# Altium footprint library En.PcbLib: 240 footprints (part 2 of 15)
Each footprint in its own frame and in the unit in brackets; x right, y up, seen from the top. Pads: shape width x height; smd on the part's side, far side on the other; paste and mask are expansions set on the pad; w line width, h text height; cw(c..) or ccw(c..) is an arc to the next point about the centre after c.
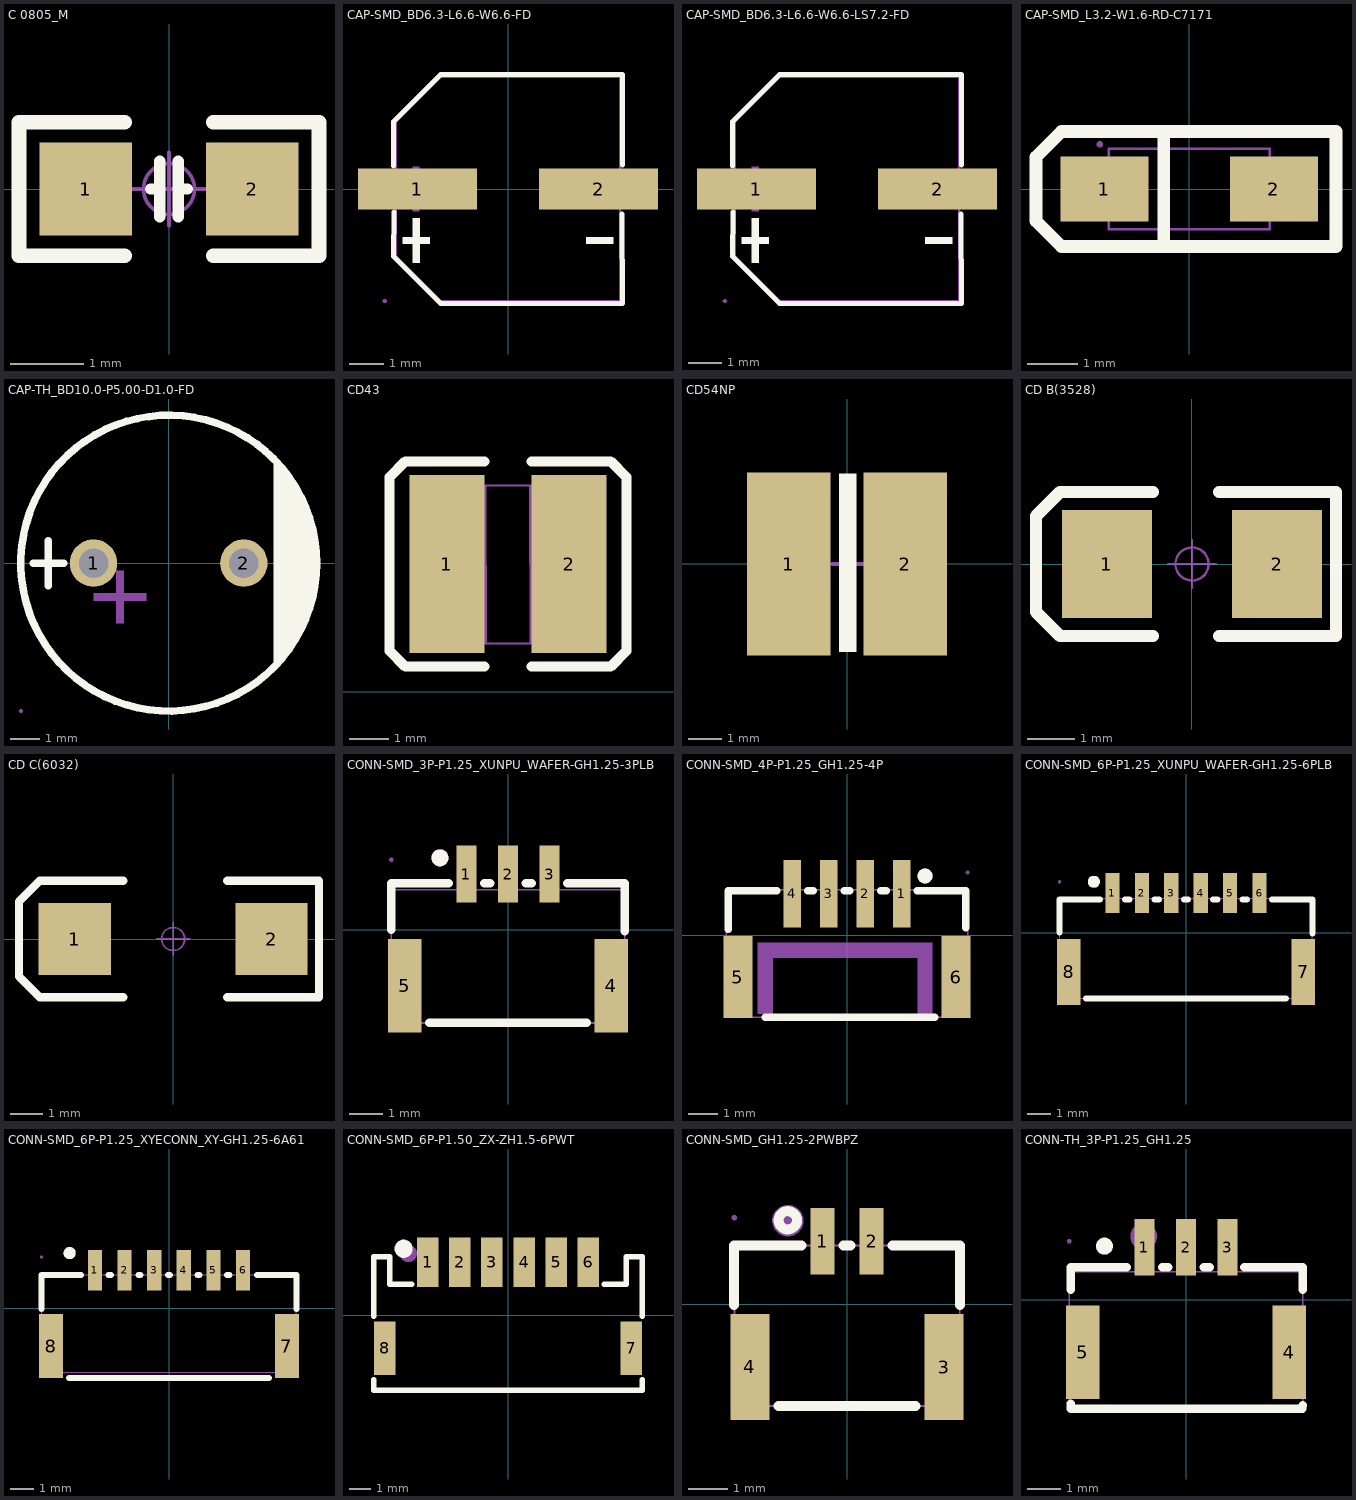
[diagram p1: the footprints below, top view; thin cyan lines are the x and y axes]

## C 0805_M [mil] "无极性贴片电容"
height 19.68
pads (2):
  rect 50x50 smd: 1(-45,0) 2(45,0)
Top Overlay:
  lines w6: -10,0 -5,0 ; -5,-15 -5,15 ; 5,-15 5,15 ; 5,0 10,0
  lines w8: -24,-36 -81,-36 -81,36 -24,36 ; 24,-36 81,-36 81,36 24,36
Mechanical 15:
  circle w1.97: c0,0 r13.78
  lines w1.97: -19.68,0 19.68,0 ; 0,-19.68 0,19.68
3D body "C 0805.STEP": height 20.08, standoff -0.39, extent -39.37,-24.02 39.37,24.02

## CAP-SMD_BD6.3-L6.6-W6.6-FD [mm]
pads (2):
  rect 3.5x1.2 smd: 1(-2.67,0) 2(2.67,0)
Top Overlay:
  region: -2.805,-0.858 -2.805,-2.178 -2.607,-2.178 -2.607,-0.858
  region: -3.102,-1.419 -3.102,-1.617 -2.31,-1.617 -2.31,-1.419
  region: 3.102,-1.419 3.102,-1.617 2.31,-1.617 2.31,-1.419
  lines w0.152: -3.376,0.686 -3.376,1.98 -1.98,3.376 3.376,3.376 3.369,0.708 ; -3.362,-0.686 -3.376,-1.981 -1.981,-3.376 3.376,-3.376 3.356,-0.739
Mechanical 6:
  region: -2.81,0.66 -2.81,-0.66 -2.612,-0.66 -2.612,0.66
  region: -3.102,0.099 -3.102,-0.099 -2.31,-0.099 -2.31,0.099
  region: 3.102,0.099 3.102,-0.099 2.31,-0.099 2.31,0.099
Mechanical 15:
  region: -3.634,0.325 -1.034,0.325 -1.034,-0.325 -3.634,-0.325
  region: 1.067,0.325 3.667,0.325 3.667,-0.325 1.067,-0.325
  region: -3.574,-3.3 -3.575,-3.276 -3.61,-3.242 -3.658,-3.242 -3.693,-3.276 -3.694,-3.3 -3.693,-3.324 -3.658,-3.358 -3.61,-3.358 -3.575,-3.324
  lines w0.051: -3.3,-1.98 -3.3,1.98 -1.98,3.3 3.3,3.3 3.3,-3.3 -1.98,-3.3 -3.3,-1.98
3D body "User Library-CC0607.SLDPRT": height 8.11, standoff 0, extent -3.5,-3.3 3.5,3.3

## CAP-SMD_BD6.3-L6.6-W6.6-LS7.2-FD [mm]
pads (2):
  rect 3.5x1.2 smd: 1(10.284,-8.636) 2(15.624,-8.636)
Top Overlay:
  region: 16.056,-10.055 16.056,-10.253 15.264,-10.253 15.264,-10.055
  region: 9.852,-10.055 9.852,-10.253 10.644,-10.253 10.644,-10.055
  region: 10.149,-9.494 10.149,-10.814 10.347,-10.814 10.347,-9.494
  lines w0.152: 9.578,-7.95 9.578,-6.656 10.974,-5.26 16.33,-5.26 16.323,-7.928 ; 9.592,-9.322 9.578,-10.617 10.973,-12.012 16.33,-12.012 16.31,-9.375
Mechanical 6:
  region: 16.056,-8.537 16.056,-8.735 15.264,-8.735 15.264,-8.537
  region: 9.852,-8.537 9.852,-8.735 10.644,-8.735 10.644,-8.537
  region: 10.149,-7.976 10.149,-9.296 10.347,-9.296 10.347,-7.976
Mechanical 15:
  region: 9.354,-8.286 12.004,-8.286 12.004,-8.986 9.354,-8.986
  region: 13.904,-8.286 16.554,-8.286 16.554,-8.986 13.904,-8.986
  region: 9.414,-11.936 9.413,-11.912 9.378,-11.878 9.33,-11.878 9.295,-11.912 9.294,-11.936 9.295,-11.96 9.33,-11.994 9.378,-11.994 9.413,-11.96
  lines w0.051: 9.654,-10.616 9.654,-6.656 10.974,-5.336 16.254,-5.336 16.254,-11.936 10.974,-11.936 9.654,-10.616
3D body "User Library-CAP SMD SVP 6.3x5.9__X2_041A043E0440043F04430441_X0_.sldprt": height 5.9, standoff 0.4, extent 9.931,-11.786 16.231,-5.486
3D body "User Library-CAP SMD SVP 6.3x5.9__X2_041C0438043D04430441_X0_.sldprt": height 5.9, standoff 5.8, extent 13.081,-11.586 16.031,-5.686
3D body "User Library-CAP SMD SVP 6.3x5.9__X2_041D043E0436043A0438_X0_.sldprt": height 0.2, standoff 0, extent 9.431,-8.986 16.731,-8.286
3D body "User Library-CAP SMD SVP 6.3x5.9__X2_041F043E0434043B043E0436043A0430_X0_.sldprt": height 1, standoff 0, extent 9.781,-11.936 16.381,-5.336

## CAP-SMD_L3.2-W1.6-RD-C7171 [mm]
pads (2):
  rect 1.758x1.296 smd: 1(-1.686,0) 2(1.686,0)
Top Overlay:
  lines w0.254: -0.508,-1.016 -0.508,1.016 ; -3.048,-0.635 -2.54,-1.143 -0.381,-1.143 2.921,-1.143 2.921,1.143 -0.889,1.143 -2.54,1.143 -3.048,0.635 -3.048,-0.635
Mechanical 15:
  region: -1.718,0.889 -1.719,0.913 -1.754,0.946 -1.802,0.946 -1.837,0.913 -1.838,0.889 -1.837,0.865 -1.802,0.832 -1.754,0.832 -1.719,0.865
  region: 1.83,0.6 1.83,-0.6 0.98,-0.6 0.98,0.6
  region: -1.83,0.6 -1.83,-0.6 -0.98,-0.6 -0.98,0.6
  lines w0.051: -1.6,-0.8 1.6,-0.8 1.6,0.8 -1.6,0.8 -1.6,-0.8
3D body "User Library-CAP_TANT_3216-18_A_case-1.SLDPRT": height 1.7, standoff 0, extent -1.7,-0.9 1.7,0.9

## CAP-TH_BD10.0-P5.00-D1.0-FD [mm]
pads (2):
  round 1.6 hole 1: 1(-2.54,0) 2(2.54,0)
Top Overlay:
  circle w0.254: c0,0 r5
  region: 3.556,3.556 3.556,-3.556 4.318,-2.54 4.826,-1.016 5.08,0.508 4.826,1.524
  lines w0.254: -4.572,0 -3.556,0 ; -4.064,-0.762 -4.064,0.762
Mechanical 6:
  region: -2.54,-1.016 -0.762,-1.016 -0.762,-1.27 -2.54,-1.27
  region: -1.778,-0.762 -1.778,-2.032 -1.524,-2.032 -1.524,-0.254 -1.778,-0.254
Mechanical 15:
  region: -4.94,-5 -4.94,-4.975 -4.975,-4.94 -5.025,-4.94 -5.06,-4.975 -5.06,-5 -5.06,-5.025 -5.025,-5.06 -4.975,-5.06 -4.94,-5.025
  region: 2.84,0 2.839,0.059 2.792,0.167 2.708,0.25 2.599,0.294 2.481,0.294 2.372,0.25 2.288,0.167 2.241,0.059 2.24,0 2.241,-0.059 2.288,-0.167 2.372,-0.25 2.481,-0.294 2.599,-0.294 2.708,-0.25 2.792,-0.167 2.839,-0.059
  region: -2.24,0 -2.241,0.059 -2.288,0.167 -2.372,0.25 -2.481,0.294 -2.599,0.294 -2.708,0.25 -2.792,0.167 -2.839,0.059 -2.84,0 -2.839,-0.059 -2.792,-0.167 -2.708,-0.25 -2.599,-0.294 -2.481,-0.294 -2.372,-0.25 -2.288,-0.167 -2.241,-0.059
  lines w0.051: -5,0 cw(c0,0) 5,0 cw(c0,0) -5,0
3D body "User Library-CE_R200_D400_H800.SLDPRT": height 20.32, standoff -2.9, extent -4.953,-5.078 5.207,5.078

## CD43 [mm]
pads (2):
  rect 1.9x4.5 smd: 1(30.787,3.236) 2(33.887,3.236)
Top Overlay:
  lines w0.254: 31.737,0.635 29.736,0.635 29.337,1.036 29.337,5.436 29.736,5.837 31.737,5.837 ; 32.936,0.635 34.938,0.635 35.336,1.036 35.336,5.436 34.938,5.837 32.936,5.837
Mechanical 15:
  drawing of 84 lines, arcs and shapes, not listed
3D body "User Library-CD43NP.sldprt": height 3.5, standoff 0, extent 29.937,1.086 34.737,5.386

## CD54NP [mm]
pads (2):
  rect 2.5x5.5 smd mask+0: 1(-1.752,-0.001) 2(1.748,-0.001)
Top Overlay:
  rectangle: -0.248,-2.644 0.276,2.722
Mechanical 2:
  lines w0.127: -0.442,-0.001 0.483,-0.001 ; -0.002,-0.257 -0.002,0.321 ; -2.831,-0.343 ccw(c-0.002,-0.001) -1.275,-2.551 -0.652,-2.551 -0.652,2.549 -1.275,2.549 ccw(c-0.002,-0.001) -2.831,0.342 cw(c-2.902,-0.001) -2.831,-0.343 ; 0.648,-2.551 1.271,-2.551 ccw(c-0.002,-0.001) 2.827,-0.343 cw(c2.898,-0.001) 2.827,0.342 ccw(c-0.002,-0.001) 1.271,2.549 0.648,2.549 0.648,-2.551
3D body "CD54.STEP": height 4.5, standoff -0.05, extent -2.895,-2.599 2.874,2.601

## CD B(3528) [mil] "长3.5mm，宽2.8mm，厚1.9mm"
height 370.08
pads (2):
  rect 75x90 smd: 1(-70.87,-0.01) 2(70.86,-0.01)
Top Overlay:
  lines w10: -32.51,-60 -110,-60 -130,-40 -130,40 -110,60 -32.51,60 ; 22.49,-60 120,-60 120,60 22.49,60
Mechanical 15:
  circle w1.97: c0,0 r13.78
  lines w1.97: -19.68,0 19.69,0 ; 0,-19.68 0,19.68
3D body "CD B(3528).STEP": height 74.84, standoff -0.3, extent -68.92,-55.12 68.91,55.11

## CD C(6032) [mm] "长6.0mm，宽3.2mm，厚2.5mm"
height 9.4
pads (2):
  rect 2.2x2.2 smd: 1(-3,0) 2(3,0)
Top Overlay:
  lines w0.254: -1.524,-1.778 -4.064,-1.778 -4.699,-1.143 -4.699,1.143 -4.064,1.778 -1.524,1.778 ; 1.651,-1.778 4.445,-1.778 4.445,1.778 1.651,1.778
Mechanical 15:
  circle w0.05: c0,0 r0.35
  lines w0.05: -0.5,0 0.5,0 ; 0,-0.5 0,0.5
3D body "CD C(6032).STEP": height 2.5, standoff -0.01, extent -3,-1.6 3,1.6

## CONN-SMD_3P-P1.25_XUNPU_WAFER-GH1.25-3PLB [mm]
pads (5):
  rect 0.6x1.7 smd: 1(-1.25,1.675) 2(0,1.675) 3(1.25,1.675)
  rect 1x2.8 smd: 4(3.1,-1.675) 5(-3.1,-1.675)
Top Overlay:
  circle w0.254: c-2.042,2.159 r0.127
  lines w0.254: -3.5,0 -3.5,1.397 -1.781,1.397 ; -2.369,-2.794 2.369,-2.794 ; -0.719,1.397 -0.531,1.397 ; 0.531,1.397 0.719,1.397 ; 1.781,1.397 3.5,1.397 3.5,-0.044
Mechanical 6:
  circle w0.254: c-2.042,2.159 r0.127
Mechanical 15:
  region: 3.2,-2.675 3,-2.675 3,-0.675 3.2,-0.675
  region: -3,-2.675 -3.2,-2.675 -3.2,-0.675 -3,-0.675
  region: 1.35,1.006 1.15,1.006 1.15,2.106 1.35,2.106
  region: 0.1,1.006 -0.1,1.006 -0.1,2.106 0.1,2.106
  region: -1.15,1.006 -1.35,1.006 -1.35,2.106 -1.15,2.106
  region: -3.44,2.106 -3.44,2.131 -3.475,2.166 -3.525,2.166 -3.56,2.131 -3.56,2.106 -3.56,2.081 -3.525,2.046 -3.475,2.046 -3.44,2.081
  lines w0.051: -3.5,-2.794 3.5,-2.794 3.5,1.206 -3.5,1.206 -3.5,-2.794
3D body "wafer-gh1.25-3plb.step": height 5.07, standoff 0.87, extent -3.535,-2.964 3.525,1.986

## CONN-SMD_4P-P1.25_GH1.25-4P [mm]
pads (6):
  rect 0.6x2.3 smd mask+0.051: 1(1.875,1.425) 2(0.625,1.425) 3(-0.625,1.425) 4(-1.875,1.425)
  rect 1x2.8 smd mask+0.051: 5(-3.725,-1.425) 6(3.725,-1.425)
Top Overlay:
  circle w0.254: c2.667,2.028 r0.127
  lines w0.254: -4.064,0.206 -4.064,1.52 -2.406,1.52 ; -2.794,-2.798 2.994,-2.798 ; -1.344,1.52 -1.156,1.52 ; -0.094,1.52 0.094,1.52 ; 1.156,1.52 1.344,1.52 ; 2.406,1.52 4.064,1.52 4.064,0.25
Mechanical 6:
  circle w0.254: c2.667,2.028 r0.127
  region: -3.048,-0.766 -3.048,-2.671 -2.54,-2.671 -2.54,-0.766
  region: -3.048,-0.258 2.921,-0.258 2.921,-2.671 2.413,-2.671 2.413,-0.766 -3.048,-0.766
Mechanical 15:
  region: 3.825,-2.798 3.625,-2.798 3.625,-0.798 3.825,-0.798
  region: -3.625,-2.798 -3.825,-2.798 -3.825,-0.798 -3.625,-0.798
  region: 1.975,1.15 1.775,1.15 1.775,2.15 1.975,2.15
  region: -1.775,1.15 -1.975,1.15 -1.975,2.15 -1.775,2.15
  region: -0.525,1.15 -0.725,1.15 -0.725,2.15 -0.525,2.15
  region: 0.725,1.15 0.525,1.15 0.525,2.15 0.725,2.15
  region: 4.185,2.15 4.185,2.175 4.15,2.21 4.1,2.21 4.065,2.175 4.065,2.15 4.065,2.125 4.1,2.09 4.15,2.09 4.185,2.125 4.185,2.15
  lines w0.051: -4.125,-2.798 4.125,-2.798 4.125,1.552 -4.125,1.552 -4.125,-2.798
3D body "User Library-GH-4-90.STEP": height 4.13, standoff -0.02, extent -4.069,-2.403 4.191,2.149

## CONN-SMD_6P-P1.25_XUNPU_WAFER-GH1.25-6PLB [mm]
pads (8):
  rect 0.6x1.7 smd: 1(-3.125,1.675) 2(-1.875,1.675) 3(-0.625,1.675) 4(0.625,1.675) 5(1.875,1.675) 6(3.125,1.675)
  rect 1x2.8 smd: 7(4.975,-1.675) 8(-4.975,-1.675)
Top Overlay:
  circle w0.254: c-3.917,2.159 r0.127
  lines w0.254: -5.375,0 -5.375,1.397 -3.656,1.397 ; -4.244,-2.794 4.244,-2.794 ; -2.594,1.397 -2.406,1.397 ; -1.344,1.397 -1.156,1.397 ; -0.094,1.397 0.094,1.397 ; 1.156,1.397 1.344,1.397 ; 2.406,1.397 2.594,1.397 ; 3.656,1.397 5.375,1.397 5.375,-0.044
Mechanical 6:
  circle w0.254: c-3.917,2.159 r0.127
Mechanical 15:
  region: -5.315,2.159 -5.316,2.183 -5.35,2.217 -5.399,2.217 -5.434,2.183 -5.435,2.159 -5.434,2.134 -5.399,2.1 -5.35,2.1 -5.316,2.134
  region: 3.225,1.359 3.025,1.359 3.025,2.159 3.225,2.159
  region: 1.975,1.359 1.775,1.359 1.775,2.159 1.975,2.159
  region: -3.025,1.359 -3.225,1.359 -3.225,2.159 -3.025,2.159
  region: -1.775,1.359 -1.975,1.359 -1.975,2.159 -1.775,2.159
  region: -0.525,1.359 -0.725,1.359 -0.725,2.159 -0.525,2.159
  region: 0.725,1.359 0.525,1.359 0.525,2.159 0.725,2.159
  region: 5.075,-2.791 4.875,-2.791 4.875,-0.791 5.075,-0.791
  region: -4.875,-2.791 -5.075,-2.791 -5.075,-0.791 -4.875,-0.791
  lines w0.051: -5.375,-2.791 -5.375,1.459 5.375,1.459 5.375,-2.791 -5.375,-2.791
3D body "zx-bx-gh1.25-lt6.step": height 4.05, standoff -0.01, extent -5.338,-2.787 5.412,2.173

## CONN-SMD_6P-P1.25_XYECONN_XY-GH1.25-6A61 [mm]
pads (8):
  rect 0.6x1.7 smd paste+0 mask+0.05: 1(-3.125,1.6) 2(-1.875,1.6) 3(-0.625,1.6) 4(0.625,1.6) 5(1.875,1.6) 6(3.125,1.6)
  rect 1x2.7 smd paste+0 mask+0.05: 7(4.975,-1.6) 8(-4.975,-1.6)
Top Overlay:
  circle w0.254: c-4.19,2.318 r0.127
  lines w0.254: -5.375,-0.033 -5.375,1.4 -3.706,1.4 ; -4.225,-2.95 4.225,-2.95 ; -2.544,1.4 -2.456,1.4 ; -1.294,1.4 -1.206,1.4 ; -0.044,1.4 0.044,1.4 ; 1.206,1.4 1.294,1.4 ; 2.456,1.4 2.544,1.4 ; 3.706,1.4 5.375,1.4 5.375,-0.033
Mechanical 6:
  circle w0.254: c-4.19,2.318 r0.127
Mechanical 15:
  region: 5.075,-2.6 4.875,-2.6 4.875,-0.6 5.075,-0.6
  region: 3.025,2.15 3.225,2.15 3.225,1.1 3.025,1.1
  region: 1.775,2.15 1.975,2.15 1.975,1.1 1.775,1.1
  region: 0.525,2.15 0.725,2.15 0.725,1.1 0.525,1.1
  region: -0.725,2.15 -0.525,2.15 -0.525,1.1 -0.725,1.1
  region: -5.075,-0.6 -4.875,-0.6 -4.875,-2.6 -5.075,-2.6
  region: -1.975,2.15 -1.775,2.15 -1.775,1.1 -1.975,1.1
  region: -3.225,2.15 -3.025,2.15 -3.025,1.1 -3.225,1.1
  region: -5.315,2.15 -5.315,2.175 -5.35,2.209 -5.399,2.209 -5.434,2.175 -5.435,2.15 -5.434,2.126 -5.4,2.091 -5.351,2.091 -5.316,2.126
  lines w0.051: -5.375,-2.7 5.375,-2.7 5.375,1.4 -5.375,1.4 -5.375,-2.7
3D body "xy-gh1.25-6a61.step": height 4.34, standoff -0.01, extent -5.375,-2.55 5.385,2.3

## CONN-SMD_6P-P1.50_ZX-ZH1.5-6PWT [mm]
pads (8):
  rect 1x2.3 smd paste+0 mask+0.05: 1(-3.75,2.473) 2(-2.25,2.473) 3(-0.75,2.473) 4(0.75,2.473) 5(2.25,2.473) 6(3.75,2.473)
  rect 1x2.5 smd paste+0 mask+0.05: 7(5.75,-1.527) 8(-5.75,-1.527)
Top Overlay:
  region: -5.285,3.108 -5.285,3.19 -5.222,3.341 -5.107,3.456 -4.956,3.519 -4.792,3.519 -4.641,3.456 -4.526,3.341 -4.463,3.19 -4.463,3.108 -4.463,3.026 -4.526,2.875 -4.641,2.76 -4.792,2.697 -4.956,2.697 -5.107,2.76 -5.222,2.875 -5.285,3.026 -5.285,3.108
  lines w0.254: -6.271,-3.007 -6.271,-3.496 6.27,-3.496 ; -6.271,-0.047 -6.271,2.727 -5.509,2.727 -5.509,1.457 -4.481,1.457 ; 4.481,1.457 5.509,1.457 5.509,2.727 6.271,2.727 6.271,-0.047 ; 6.271,-3.496 6.271,-3.007
Mechanical 15:
  circle w0.4: c-4.651,2.886 r0.2

## CONN-SMD_GH1.25-2PWBPZ [mm]
pads (4):
  rect 0.6x1.7 smd mask+0.051: 1(-0.625,1.602) 2(0.625,1.602)
  rect 1x2.7 smd mask+0.051: 3(2.475,-1.602) 4(-2.475,-1.598)
Top Overlay:
  circle w0.254: c-1.51,2.14 r0.233
  lines w0.254: -2.88,-0.017 -2.88,1.5 -1.156,1.5 ; -1.744,-2.6 1.744,-2.6 ; -0.094,1.5 0.094,1.5 ; 1.156,1.5 2.88,1.5 2.88,-0.021
Mechanical 6:
  circle w0.4: c-1.51,2.13 r0.2
Mechanical 15:
  region: -2.575,-0.598 -2.375,-0.598 -2.375,-2.598 -2.575,-2.598
  region: 2.375,-0.602 2.575,-0.602 2.575,-2.602 2.375,-2.602
  region: -0.725,2.202 -0.525,2.202 -0.525,1.002 -0.725,1.002
  region: 0.525,2.202 0.725,2.202 0.725,1.002 0.525,1.002
  region: -2.815,2.202 -2.815,2.227 -2.85,2.262 -2.9,2.262 -2.935,2.227 -2.935,2.202 -2.935,2.177 -2.9,2.142 -2.85,2.142 -2.815,2.177 -2.815,2.202
  lines w0.051: -2.875,-2.598 2.875,-2.598 2.875,1.502 -2.875,1.502 -2.875,-2.598
3D body "User Library-GH-2-180.sldprt": height 4.22, standoff 0.02, extent -3.007,-2.665 2.753,2.285

## CONN-TH_3P-P1.25_GH1.25 [mm]
pads (5):
  rect 0.6x1.7 smd paste+0 mask+0.05: 1(-1.25,1.575) 2(0,1.575) 3(1.25,1.575)
  rect 1x2.8 smd paste+0 mask+0.05: 4(3.1,-1.575) 5(-3.1,-1.575)
Top Overlay:
  circle w0.254: c-2.447,1.613 r0.127
  lines w0.254: -3.463,-3.108 -3.463,-3.272 3.495,-3.272 3.5,-3.162 ; -3.463,0.306 -3.463,0.978 -1.781,0.978 ; -0.719,0.978 -0.531,0.978 ; 0.531,0.978 0.719,0.978 ; 1.744,0.978 3.5,0.978 3.5,0.306
Mechanical 6:
  circle w0.4: c-1.27,1.905 r0.2
Mechanical 15:
  region: 3.2,-2.678 3,-2.678 3,-0.878 3.2,-0.878
  region: -1.35,1.766 -1.15,1.766 -1.15,0.766 -1.35,0.766
  region: 1.15,1.766 1.35,1.766 1.35,0.766 1.15,0.766
  region: -0.1,1.766 0.1,1.766 0.1,0.766 -0.1,0.766
  region: -3.2,-0.878 -3,-0.878 -3,-2.678 -3.2,-2.678
  region: -3.441,1.766 -3.441,1.791 -3.476,1.826 -3.526,1.826 -3.561,1.791 -3.561,1.766 -3.561,1.741 -3.526,1.706 -3.476,1.706 -3.441,1.741
  lines w0.051: -3.5,-3.205 -3.5,-1.223 -3.5,0.846 3.5,0.846 3.5,-3.205 -3.5,-3.205
3D body "wafer-gh1.25-3pwb.step": height 4.32, standoff 0, extent -3.5,-3.168 3.51,1.682